# Altium footprint library Vowstar_Connector.PcbLib: 127 footprints (part 6 of 8)
Each footprint in its own frame and in the unit in brackets; x right, y up, seen from the top. Pads: shape width x height; smd on the part's side, far side on the other; paste and mask are expansions set on the pad; w line width, h text height; cw(c..) or ccw(c..) is an arc to the next point about the centre after c.
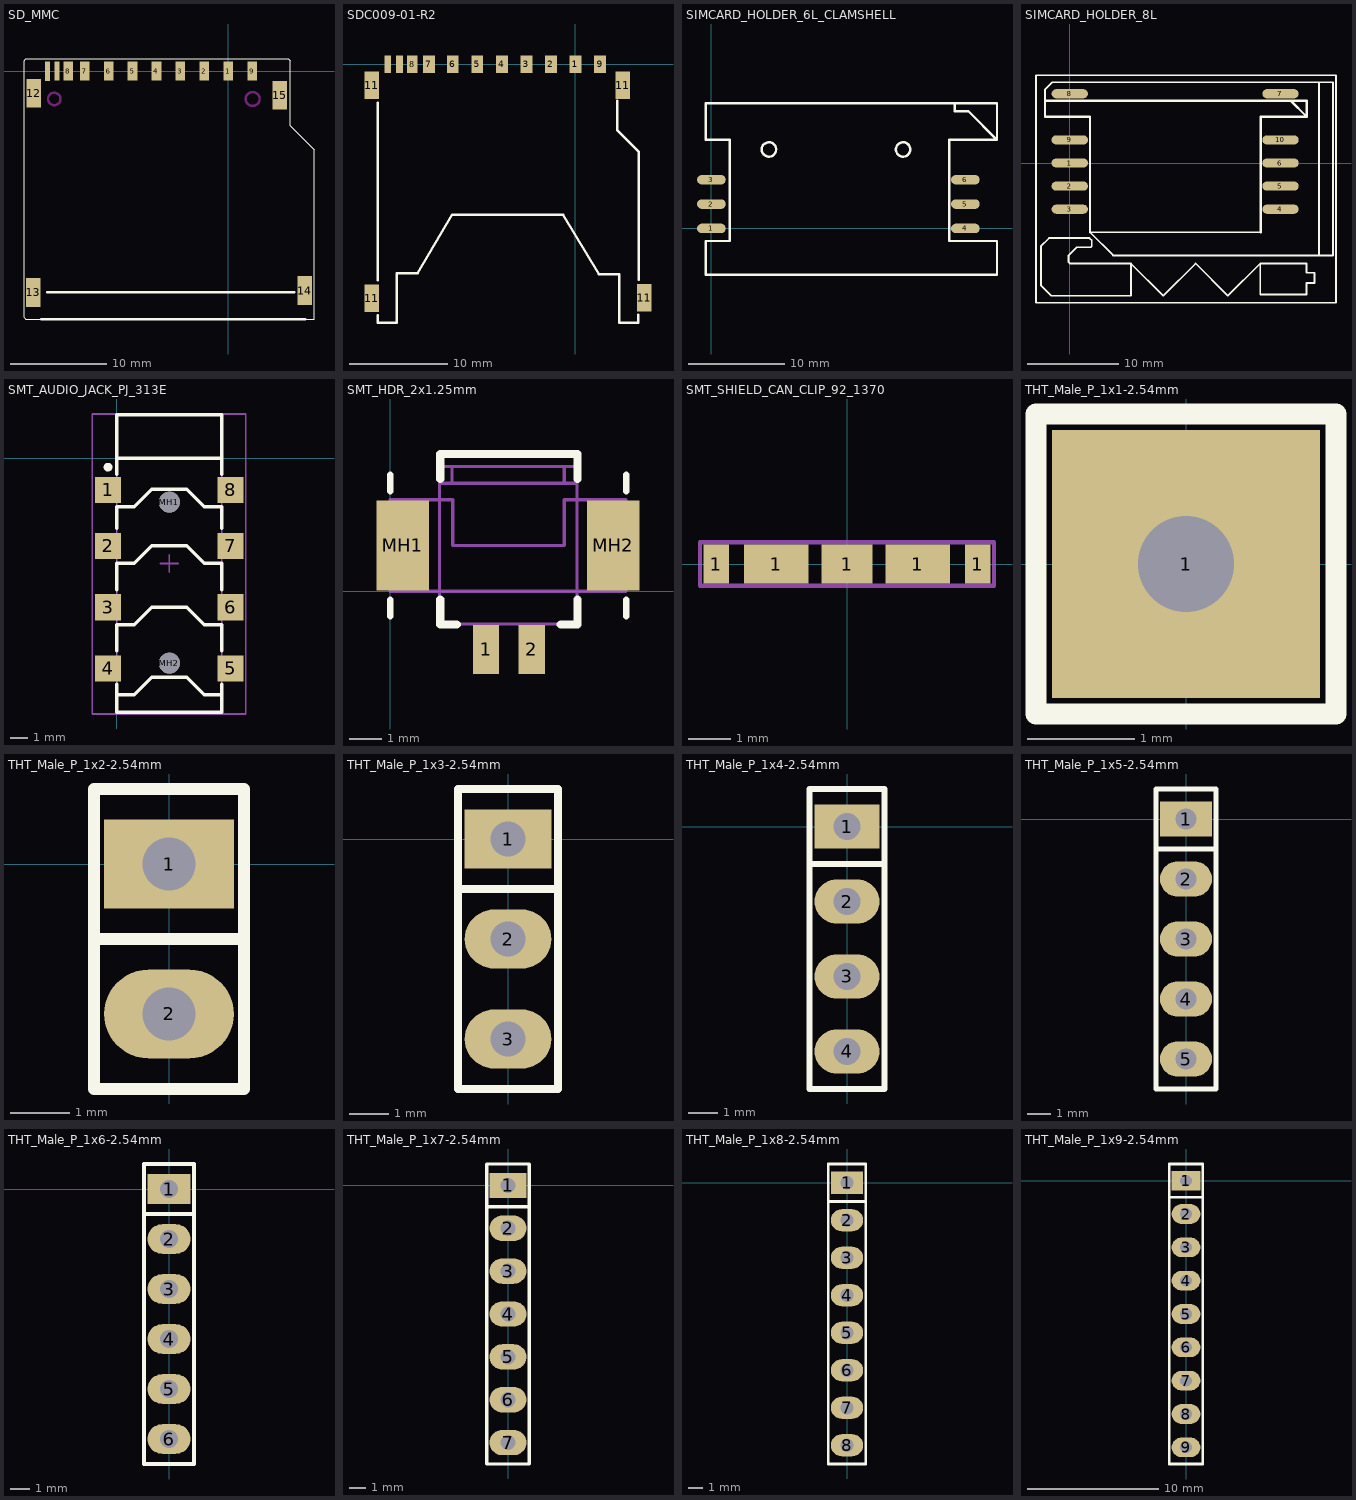
[diagram p5: the footprints below, top view; thin cyan lines are the x and y axes]

## SD_MMC [mm] "SD and MMC CARD Holder"
pads (15):
  rect 1x2 smd: 1(0,0) 2(-2.5,0) 3(-5,0) 4(-7.5,0) 5(-10,0) 6(-12.5,0) 7(-15,0) 8(-16.7,0) 9(2.5,0)
  rect 0.5x2 smd: 10(-17.894,0) 11(-18.884,-0.025)
  rect 1.5x3 smd: 12(-20.33,-2.315) 13(-20.355,-23.115) 14(7.97,-22.915) 15(5.37,-2.515)
Top Overlay:
  lines w0.076: -20.83,-25.915 8.97,-25.915 ; -18.73,-25.915 -21.13,-25.915 -21.23,-25.815 -21.33,-25.715 -21.33,1.085 -21.13,1.285 6.27,1.285 6.47,1.085 6.47,-5.715 8.97,-8.215 8.97,-25.915 ; 8.97,-25.915 8.97,-25.915
  lines w0.254: -19.555,-25.915 8.045,-25.915 ; -18.93,-23.115 6.87,-23.115
Keep-Out Layer:
  circle w0.254: c-18.18,-2.915 r0.65
  circle w0.254: c2.543,-2.915 r0.727

## SDC009-01-R2 [mm]
pads (15):
  rect 1.2x1.8 smd: 1(0,0) 2(-2.489,0) 3(-4.983,-0.009) 4(-7.483,-0.009) 5(-9.983,-0.009) 6(-12.483,-0.009) 7(-14.908,-0.009) 9(2.517,-0.009)
  rect 1.1x1.8 smd: 8(-16.612,0)
  rect 0.7x1.8 smd: 10(-17.908,-0.009) 12(-19.101,0)
  rect 1.5x2.8 smd: 11(-20.726,-23.834) 11(-20.726,-2.143) 11(4.826,-2.143) 11(7.01,-23.784)
Top Overlay:
  lines w0.254: -20.131,-25.563 -20.131,-26.3 -18.158,-26.3 -18.158,-21.3 ; -20.117,-21.985 -20.117,-3.937 ; -18.107,-21.294 -16.065,-21.294 -12.553,-15.3 ; -12.458,-15.3 -1.258,-15.3 2.4,-21.402 4.442,-21.402 4.442,-26.3 6.415,-26.3 ; 4.242,-3.734 4.242,-6.71 6.431,-8.899 6.426,-21.946 ; 6.401,-26.286 6.415,-26.3 ; 6.415,-25.516 6.415,-26.3
Multi-Layer:
  circle w0.254: c2.642,-3.26 r0.82
  circle w0.254: c-18.39,-3.3 r0.58

## SIMCARD_HOLDER_6L_CLAMSHELL [mm] "Simcard holder"
pads (6):
  oval 3x1 smd: 1(0,0) 2(0,2.54) 3(0,5.08) 4(26.5,0) 5(26.5,2.54) 6(26.5,5.08)
Top Overlay:
  circle w0.254: c6,8.24 r0.75
  circle w0.254: c20,8.24 r0.75
  lines w0.254: 25.4,13.04 25.4,12.24 26.8,12.24 29.8,9.24 ; 29.8,9.24 29.8,13.04 24.049,13.04 -0.6,13.04 -0.6,9.24 1.9,9.24 1.9,-1.31 -0.6,-1.31 -0.6,-4.81 29.8,-4.81 29.8,-1.31 24.8,-1.31 24.8,9.24 29.8,9.24
3D body "User Library-SIMCARD-HOLDER-5060-6-0-26-01-A.STEP": height 2.6, standoff -0.7, extent 0.232,-4.79 29.872,12.41

## SIMCARD_HOLDER_8L [mm] "Simcard holder"
pads (10):
  oval 4x1 smd: 1(0,0) 2(0,-2.54) 3(0,-5.08) 4(23.178,-5.08) 5(23.178,-2.54) 6(23.178,0) 7(23.178,7.62) 8(0,7.62) 9(0,2.54) 10(23.178,2.54)
Top Overlay:
  lines w0.2: -2.73,5.08 -2.73,6.858 -2.73,8.065 -1.905,8.89 27.432,8.89 ; 20.994,-7.62 2.223,-7.62 4.763,-10.16 27.686,-10.16 ; 29.21,-15.367 -3.683,-15.367 -3.714,-15.336 -3.714,9.621 -3.683,9.652 12.237,9.652 29.21,9.652 ; 29.286,-15.367 29.286,9.652 ; 6.731,-11.049 10.287,-14.605 13.843,-11.049 17.399,-14.605 20.955,-11.049 ; 6.731,-11.049 6.731,-14.605 -2.032,-14.605 -3.175,-13.462 -3.175,-9.144 -2.286,-8.255 2.159,-8.255 2.413,-8.509 2.413,-9.144 2.286,-9.271 0.762,-9.271 -0.127,-10.16 -0.127,-10.922 0,-11.049 6.731,-11.049 ; 20.955,-11.049 26.035,-11.049 26.035,-12.065 26.924,-12.065 26.924,-13.208 26.035,-13.208 26.035,-14.478 20.955,-14.478 20.955,-11.049 ; 27.432,8.89 28.956,8.89 28.956,-10.16 27.432,-10.16 27.432,8.89
  lines w0.254: -2.73,5.08 2.223,5.08 2.223,-7.62 ; -2.73,6.858 26.074,6.858 26.074,5.08 ; 20.994,-7.62 20.994,5.08 26.074,5.08 ; 24.276,6.877 26.074,5.08

## SMT_AUDIO_JACK_PJ_313E [mm] "PJ-313E 3.5mm SMT Audio Jack"
height 5.2
pads (10):
  rect 1.5x1.5 smd: 1(-0.5,-1.8) 2(-0.5,-5) 3(-0.5,-8.5) 4(-0.5,-12) 5(6.5,-12) 6(6.5,-8.5) 7(6.5,-5) 8(6.5,-1.8)
  round 1.2 hole 1.2 unplated paste+0 mask+0: MH1(3,-2.5) MH2(3,-11.7)
Top Overlay:
  circle w0.25: c-0.5,-0.5 r0.125
  lines w0.2: 0,-13.5 1,-13.5 2,-12.5 4,-12.5 5,-13.5 6,-13.5 ; 0,-12.9 0,-14.5 6,-14.5 6,-12.9 ; 0,-11 0,-9.5 1,-9.5 2,-8.5 4,-8.5 5,-9.5 6,-9.5 6,-11 ; 0,-7.5 0,-6 1,-6 2,-5 4,-5 5,-6 6,-6 6,-7.5 ; 0,-4 0,-2.75 1,-2.75 2,-1.75 4,-1.75 5,-2.75 6,-2.75 6,-4 ; 0,-0.9 0,0 ; 6,-0.9 6,0 ; 0,0 0,2.5 6,2.5 6,0 ; 0,0 6,0
Mechanical 13:
  lines w0.1: 0,0 0,-14.6 6,-14.6 6,0 ; 0,0 0,2.5 6,2.5 6,0 ; 0,0 6,0
  text "PCB Edge" at 0.254,0.254 h0.25
Mechanical 15:
  lines w0.1: 2.5,-6 3.5,-6 ; 3,-6.5 3,-5.5 ; -1.397,-14.605 7.366,-14.605 7.366,2.54 -1.397,2.54 -1.397,-14.605
3D body "Audio-Jack-3.5mm.STEP": height 5.06, standoff -0.59, extent -0.981,-14.513 7,2.512

## SMT_HDR_2x1.25mm [mm] "Surface mount header 2x1.25mm"
height 3.44
pads (4):
  rect 0.8x1.5 smd: 1(2.921,-1.778) 2(4.318,-1.778)
  rect 1.6x2.74 smd: MH1(0.381,1.397) MH2(6.805,1.397)
Top Overlay:
  lines w0.2: 0,-0.762 0,-0.254 ; 0,3.048 0,3.556 ; 7.2,-0.762 7.2,-0.254 ; 7.2,3.048 7.2,3.556
  lines w0.254: 1.524,-0.254 1.524,-1.016 2.032,-1.016 ; 1.524,3.429 1.524,4.191 5.715,4.191 5.715,3.429 ; 5.207,-1.016 5.715,-1.016 5.715,-0.254
Mechanical 13:
  lines w0.1: 1.881,3.302 1.881,3.81 ; 5.31,2.794 5.31,1.397 1.905,1.397 1.905,2.794 0,2.794 0,0 7.2,0 7.2,2.794 5.334,2.794 ; 5.31,3.302 5.31,3.81 ; 1.5,-1 5.7,-1 5.7,3.302 1.5,3.302 1.5,-1 ; 1.5,3.81 1.5,4.191 5.7,4.191 5.7,3.81 1.5,3.81
3D body: height 3.44, standoff 0, extent 0,0 7.239,2.794
3D body: height 2.1, standoff 0, extent 1.397,-1.143 5.842,3.048
3D body: height 1.38, standoff 0, extent 3.048,-2.349 3.175,-0.699
3D body: height 1.38, standoff 0, extent 4.064,-2.349 4.191,-0.699

## SMT_SHIELD_CAN_CLIP_92_1370 [mm] "Surface mount shield can clip 92-1370"
height 1.27
pads (5):
  rect 0.6x0.9 smd: 1(-3.05,0) 1(3.05,0)
  rect 1.5x0.9 smd: 1(-1.65,0) 1(1.65,0)
  rect 1.2x0.9 smd: 1(0,0)
Mechanical 13:
  lines w0.1: -3.429,-0.508 -3.429,0.508 3.429,0.508 3.429,-0.508 -3.429,-0.508
Mechanical 15:
  lines w0.1: -0.3,0 0.3,0 ; 0,-0.3 0,0.3 ; -3.429,-0.508 3.429,-0.508 3.429,0.508 -3.429,0.508 -3.429,-0.508
3D body "User Library-tiny-clip.STEP": height 1.27, standoff 0, extent -3.25,-0.463 3.25,0.463

## THT_Male_P_1x1-2.54mm [mm] "THT Male pin header strip 1x1 2.54mm pitch"
height 11.43
pads (1):
  rect 2.5x2.5 hole 0.9: 1(0,0)
Top Overlay:
  lines w0.2: -1.4,-1.4 1.4,-1.4 1.4,1.4 -1.4,1.4 -1.4,-1.4
3D body "User Library-Male-Pin Header Strip-1x1-2.54mm.step": height 8.51, standoff -3.68, extent -1.46,-1.27 1.46,1.27

## THT_Male_P_1x2-2.54mm [mm] "THT Male pin header strip 1x2 2.54mm pitch"
height 11.43
pads (2):
  rect 2.2x1.5 hole 0.9: 1(0,0)
  oval 2.2x1.5 hole 0.9: 2(0,-2.54)
Top Overlay:
  lines w0.2: -1.27,-1.27 1.27,-1.27 ; -1.27,-3.81 1.27,-3.81 1.27,1.27 -1.27,1.27 -1.27,-3.81
3D body "User Library-Male-Pin Header Strip-1x1-2.54mm.step": height 8.51, standoff -3.68, extent -1.46,-1.27 1.46,1.27
3D body "User Library-Male-Pin Header Strip-1x1-2.54mm.step": height 8.51, standoff -3.68, extent -1.46,-3.81 1.46,-1.27

## THT_Male_P_1x3-2.54mm [mm] "THT Male pin header strip 1x3 2.54mm pitch"
height 11.43
pads (3):
  rect 2.2x1.5 hole 0.9: 1(0,0)
  oval 2.2x1.5 hole 0.9: 2(0,-2.54) 3(0,-5.08)
Top Overlay:
  lines w0.2: -1.27,-1.27 1.27,-1.27 ; -1.27,-6.35 -1.27,1.27 1.27,1.27 1.27,-6.35 -1.27,-6.35
3D body "User Library-Male-Pin Header Strip-1x1-2.54mm.step": height 8.51, standoff -3.68, extent -1.46,-1.27 1.46,1.27
3D body "User Library-Male-Pin Header Strip-1x1-2.54mm.step": height 8.51, standoff -3.68, extent -1.46,-3.81 1.46,-1.27
3D body "User Library-Male-Pin Header Strip-1x1-2.54mm.step": height 8.51, standoff -3.68, extent -1.46,-6.35 1.46,-3.81

## THT_Male_P_1x4-2.54mm [mm] "THT Male pin header strip 1x4 2.54mm pitch"
height 11.43
pads (4):
  rect 2.2x1.5 hole 0.9: 1(0,0)
  oval 2.2x1.5 hole 0.9: 2(0,-2.54) 3(0,-5.08) 4(0,-7.62)
Top Overlay:
  lines w0.2: -1.27,-1.27 1.27,-1.27 ; -1.27,-8.89 1.27,-8.89 1.27,1.27 -1.27,1.27 -1.27,-8.89
3D body "User Library-Male-Pin Header Strip-1x1-2.54mm.step": height 8.51, standoff -3.68, extent -1.46,-8.89 1.46,-6.35
3D body "User Library-Male-Pin Header Strip-1x1-2.54mm.step": height 8.51, standoff -3.68, extent -1.46,-1.27 1.46,1.27
3D body "User Library-Male-Pin Header Strip-1x1-2.54mm.step": height 8.51, standoff -3.68, extent -1.46,-3.81 1.46,-1.27
3D body "User Library-Male-Pin Header Strip-1x1-2.54mm.step": height 8.51, standoff -3.68, extent -1.46,-6.35 1.46,-3.81

## THT_Male_P_1x5-2.54mm [mm] "THT Male pin header strip 1x5 2.54mm pitch"
height 11.43
pads (5):
  rect 2.2x1.5 hole 0.9: 1(0,0)
  oval 2.2x1.5 hole 0.9: 2(0,-2.54) 3(0,-5.08) 4(0,-7.62) 5(0,-10.16)
Top Overlay:
  lines w0.2: -1.27,-1.27 1.27,-1.27 ; -1.27,-11.43 1.27,-11.43 1.27,1.27 -1.27,1.27 -1.27,-11.43
3D body "User Library-Male-Pin Header Strip-1x1-2.54mm.step": height 8.51, standoff -3.68, extent -1.46,-11.43 1.46,-8.89
3D body "User Library-Male-Pin Header Strip-1x1-2.54mm.step": height 8.51, standoff -3.68, extent -1.46,-8.89 1.46,-6.35
3D body "User Library-Male-Pin Header Strip-1x1-2.54mm.step": height 8.51, standoff -3.68, extent -1.46,-6.35 1.46,-3.81
3D body "User Library-Male-Pin Header Strip-1x1-2.54mm.step": height 8.51, standoff -3.68, extent -1.46,-3.81 1.46,-1.27
3D body "User Library-Male-Pin Header Strip-1x1-2.54mm.step": height 8.51, standoff -3.68, extent -1.46,-1.27 1.46,1.27

## THT_Male_P_1x6-2.54mm [mm] "THT Male pin header strip 1x6 2.54mm pitch"
height 11.43
pads (6):
  rect 2.2x1.5 hole 0.9: 1(0,0)
  oval 2.2x1.5 hole 0.9: 2(0,-2.54) 3(0,-5.08) 4(0,-7.62) 5(0,-10.16) 6(0,-12.7)
Top Overlay:
  lines w0.2: -1.27,-1.27 1.27,-1.27 ; -1.27,-13.97 -1.27,1.27 1.27,1.27 1.27,-13.97 -1.27,-13.97
3D body "User Library-Male-Pin Header Strip-1x1-2.54mm.step": height 8.51, standoff -3.68, extent -1.46,-6.35 1.46,-3.81
3D body "User Library-Male-Pin Header Strip-1x1-2.54mm.step": height 8.51, standoff -3.68, extent -1.46,-3.81 1.46,-1.27
3D body "User Library-Male-Pin Header Strip-1x1-2.54mm.step": height 8.51, standoff -3.68, extent -1.46,-1.27 1.46,1.27
3D body "User Library-Male-Pin Header Strip-1x1-2.54mm.step": height 8.51, standoff -3.68, extent -1.46,-13.97 1.46,-11.43
3D body "User Library-Male-Pin Header Strip-1x1-2.54mm.step": height 8.51, standoff -3.68, extent -1.46,-11.43 1.46,-8.89
3D body "User Library-Male-Pin Header Strip-1x1-2.54mm.step": height 8.51, standoff -3.68, extent -1.46,-8.89 1.46,-6.35

## THT_Male_P_1x7-2.54mm [mm] "THT Male pin header strip 1x7 2.54mm pitch"
height 11.43
pads (7):
  rect 2.2x1.5 hole 0.9: 1(0,0)
  oval 2.2x1.5 hole 0.9: 2(0,-2.54) 3(0,-5.08) 4(0,-7.62) 5(0,-10.16) 6(0,-12.7) 7(0,-15.24)
Top Overlay:
  lines w0.2: -1.27,-1.27 1.27,-1.27 ; -1.27,-16.51 1.27,-16.51 1.27,1.27 -1.27,1.27 -1.27,-16.51
3D body "User Library-Male-Pin Header Strip-1x1-2.54mm.step": height 8.51, standoff -3.68, extent -1.46,-6.35 1.46,-3.81
3D body "User Library-Male-Pin Header Strip-1x1-2.54mm.step": height 8.51, standoff -3.68, extent -1.46,-3.81 1.46,-1.27
3D body "User Library-Male-Pin Header Strip-1x1-2.54mm.step": height 8.51, standoff -3.68, extent -1.46,-1.27 1.46,1.27
3D body "User Library-Male-Pin Header Strip-1x1-2.54mm.step": height 8.51, standoff -3.68, extent -1.46,-13.97 1.46,-11.43
3D body "User Library-Male-Pin Header Strip-1x1-2.54mm.step": height 8.51, standoff -3.68, extent -1.46,-11.43 1.46,-8.89
3D body "User Library-Male-Pin Header Strip-1x1-2.54mm.step": height 8.51, standoff -3.68, extent -1.46,-8.89 1.46,-6.35
3D body "User Library-Male-Pin Header Strip-1x1-2.54mm.step": height 8.51, standoff -3.68, extent -1.46,-16.51 1.46,-13.97

## THT_Male_P_1x8-2.54mm [mm] "THT Male pin header strip 1x8 2.54mm pitch"
height 11.43
pads (8):
  rect 2.2x1.5 hole 0.9: 1(0,0)
  oval 2.2x1.5 hole 0.9: 2(0,-2.54) 3(0,-5.08) 4(0,-7.62) 5(0,-10.16) 6(0,-12.7) 7(0,-15.24) 8(0,-17.78)
Top Overlay:
  lines w0.2: -1.27,-1.27 1.27,-1.27 ; -1.27,-19.05 -1.27,1.27 1.27,1.27 1.27,-19.05 -1.27,-19.05
3D body "User Library-Male-Pin Header Strip-1x1-2.54mm.step": height 8.51, standoff -3.68, extent -1.46,-13.97 1.46,-11.43
3D body "User Library-Male-Pin Header Strip-1x1-2.54mm.step": height 8.51, standoff -3.68, extent -1.46,-16.51 1.46,-13.97
3D body "User Library-Male-Pin Header Strip-1x1-2.54mm.step": height 8.51, standoff -3.68, extent -1.46,-19.05 1.46,-16.51
3D body "User Library-Male-Pin Header Strip-1x1-2.54mm.step": height 8.51, standoff -3.68, extent -1.46,-11.43 1.46,-8.89
3D body "User Library-Male-Pin Header Strip-1x1-2.54mm.step": height 8.51, standoff -3.68, extent -1.46,-3.81 1.46,-1.27
3D body "User Library-Male-Pin Header Strip-1x1-2.54mm.step": height 8.51, standoff -3.68, extent -1.46,-6.35 1.46,-3.81
3D body "User Library-Male-Pin Header Strip-1x1-2.54mm.step": height 8.51, standoff -3.68, extent -1.46,-8.89 1.46,-6.35
3D body "User Library-Male-Pin Header Strip-1x1-2.54mm.step": height 8.51, standoff -3.68, extent -1.46,-1.27 1.46,1.27

## THT_Male_P_1x9-2.54mm [mm] "THT Male pin header strip 1x9 2.54mm pitch"
height 11.43
pads (9):
  rect 2.2x1.5 hole 0.9: 1(0,0)
  oval 2.2x1.5 hole 0.9: 2(0,-2.54) 3(0,-5.08) 4(0,-7.62) 5(0,-10.16) 6(0,-12.7) 7(0,-15.24) 8(0,-17.78) 9(0,-20.32)
Top Overlay:
  lines w0.2: -1.27,-1.27 1.27,-1.27 ; -1.27,-21.59 1.27,-21.59 1.27,1.27 -1.27,1.27 -1.27,-21.59
3D body "User Library-Male-Pin Header Strip-1x1-2.54mm.step": height 8.51, standoff -3.68, extent -1.46,-16.51 1.46,-13.97
3D body "User Library-Male-Pin Header Strip-1x1-2.54mm.step": height 8.51, standoff -3.68, extent -1.46,-19.05 1.46,-16.51
3D body "User Library-Male-Pin Header Strip-1x1-2.54mm.step": height 8.51, standoff -3.68, extent -1.46,-21.59 1.46,-19.05
3D body "User Library-Male-Pin Header Strip-1x1-2.54mm.step": height 8.51, standoff -3.68, extent -1.46,-13.97 1.46,-11.43
3D body "User Library-Male-Pin Header Strip-1x1-2.54mm.step": height 8.51, standoff -3.68, extent -1.46,-6.35 1.46,-3.81
3D body "User Library-Male-Pin Header Strip-1x1-2.54mm.step": height 8.51, standoff -3.68, extent -1.46,-8.89 1.46,-6.35
3D body "User Library-Male-Pin Header Strip-1x1-2.54mm.step": height 8.51, standoff -3.68, extent -1.46,-11.43 1.46,-8.89
3D body "User Library-Male-Pin Header Strip-1x1-2.54mm.step": height 8.51, standoff -3.68, extent -1.46,-3.81 1.46,-1.27
3D body "User Library-Male-Pin Header Strip-1x1-2.54mm.step": height 8.51, standoff -3.68, extent -1.46,-1.27 1.46,1.27